# Altium footprint library myPcbLib.PcbLib: 987 footprints (part 54 of 62)
Each footprint in its own frame and in the unit in brackets; x right, y up, seen from the top. Pads: shape width x height; smd on the part's side, far side on the other; paste and mask are expansions set on the pad; w line width, h text height; cw(c..) or ccw(c..) is an arc to the next point about the centre after c.
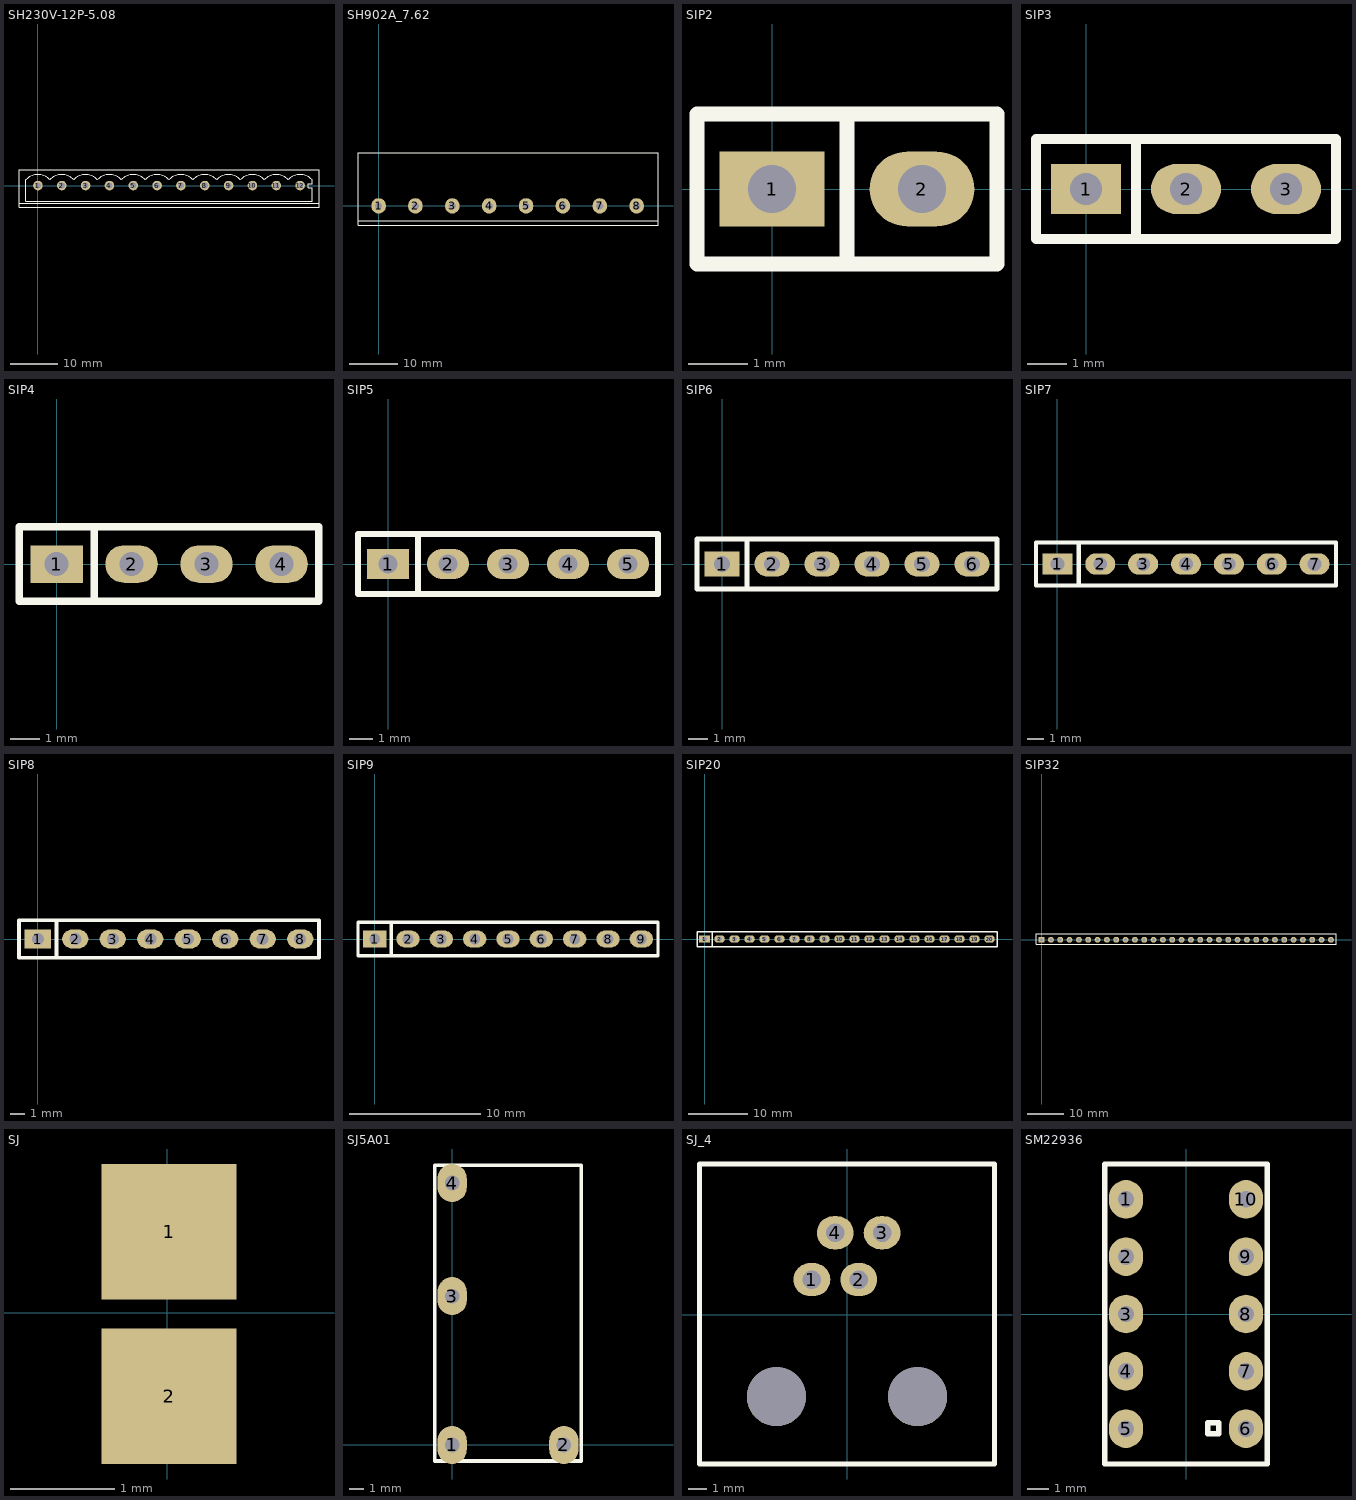
[diagram p53: the footprints below, top view; thin cyan lines are the x and y axes]

## SH230V-12P-5.08 [mil]
height 60
pads (12):
  round 80 hole 52: 1(0,0) 2(200,0) 3(400,0) 4(600,0) 5(800,0) 6(1000,0) 7(1200,0) 8(1400,0) 9(1600,0) 10(1800,0) 11(2000,0) 12(2200,0)
Top Overlay:
  lines w8: -100.96,50.17 cw(c-0.79,-50) 99.39,50.17 ; 99.04,50.17 cw(c199.21,-50) 299.39,50.17 ; 299.04,50.17 cw(c399.21,-50) 499.39,50.17 ; 499.04,50.17 cw(c599.21,-50) 699.39,50.17 ; 699.04,50.17 cw(c799.21,-50) 899.39,50.17 ; 899.04,50.17 cw(c999.21,-50) 1099.39,50.17 ; 1099.04,50.17 cw(c1199.21,-50) 1299.39,50.17 ; 1299.04,50.17 cw(c1399.21,-50) 1499.39,50.17 ; 1499.04,50.17 cw(c1599.21,-50) 1699.39,50.17 ; 1699.04,50.17 cw(c1799.21,-50) 1899.39,50.17 ; 1899.04,50.17 cw(c1999.21,-50) 2099.39,50.17 ; 2099.83,50.17 cw(c2200,-50) 2300.17,50.17
  lines w10: -159.12,-150 2358.33,-150 ; -100.79,50 -100.79,-133.33 2300,-133.33 2300,-16.67 2266.67,-16.67 2266.67,16.67 2300,16.67 2300,50 ; -159.12,-180.31 2358.33,-180.31 2358.33,133.33 -159.12,133.33 -159.12,-180.31

## SH902A_7.62 [mm] "美规端子"
height 15
pads (8):
  oval 3x3.2 hole 1.5: 1(0,0) 2(7.62,0) 3(15.24,0) 4(22.86,0) 5(30.48,0) 6(38.1,0) 7(45.72,0) 8(53.34,0)
Top Overlay:
  lines w0.254: -4.25,0 -4.25,-4 57.75,-4 57.75,-2.5 ; -4.25,-3.1 -4.25,11 57.75,11 57.75,-3.1 -4.25,-3.1

## SIP2 [mil]
pads (2):
  rect 70x50 hole 32: 1(0,0)
  oval 70x50 hole 32: 2(100,0)
Top Overlay:
  lines w10: 50,-50 50,50 ; -50,-50 -50,50 150,50 150,-50 -50,-50

## SIP3 [mil]
pads (3):
  rect 70x50 hole 32: 1(0,0)
  oval 70x50 hole 32: 2(100,0) 3(200,0)
Top Overlay:
  lines w10: 50,-50 50,50 ; -50,-50 -50,50 250,50 250,-50 -50,-50

## SIP4 [mil]
pads (4):
  rect 70x50 hole 32: 1(0,0)
  oval 70x50 hole 32: 2(100,0) 3(200,0) 4(300,0)
Top Overlay:
  lines w10: 50,-50 50,50 ; -50,-50 -50,50 350,50 350,-50 -50,-50

## SIP5 [mil]
pads (5):
  rect 70x50 hole 32: 1(0,0)
  oval 70x50 hole 32: 2(100,0) 3(200,0) 4(300,0) 5(400,0)
Top Overlay:
  lines w10: 50,-50 50,50 ; -50,-50 -50,50 450,50 450,-50 -50,-50

## SIP6 [mil]
pads (6):
  rect 70x50 hole 32: 1(0,0)
  oval 70x50 hole 32: 2(100,0) 3(200,0) 4(300,0) 5(400,0) 6(500,0)
Top Overlay:
  lines w10: 50,-50 50,50 ; -50,-50 550,-50 550,50 -50,50 -50,-50

## SIP7 [mil]
pads (7):
  rect 70x50 hole 32: 1(0,0)
  oval 70x50 hole 32: 2(100,0) 3(200,0) 4(300,0) 5(400,0) 6(500,0) 7(600,0)
Top Overlay:
  lines w10: 50,-50 50,50 ; -50,-50 -50,50 650,50 650,-50 -50,-50

## SIP8 [mil]
pads (8):
  rect 70x50 hole 32: 1(0,0)
  oval 70x50 hole 32: 2(100,0) 3(200,0) 4(300,0) 5(400,0) 6(500,0) 7(600,0) 8(700,0)
Top Overlay:
  lines w10: 50,-50 50,50 ; -50,-50 -50,50 750,50 750,-50 -50,-50

## SIP9 [mil]
pads (9):
  rect 70x50 hole 32: 1(0,0)
  oval 70x50 hole 32: 2(100,0) 3(200,0) 4(300,0) 5(400,0) 6(500,0) 7(600,0) 8(700,0) 9(800,0)
Top Overlay:
  lines w10: 50,-50 50,50 ; -50,-50 850,-50 850,50 -50,50 -50,-50

## SIP20 [mil]
pads (20):
  rect 70x50 hole 32: 1(0,0)
  oval 70x50 hole 32: 2(100,0) 3(200,0) 4(300,0) 5(400,0) 6(500,0) 7(600,0) 8(700,0) 9(800,0) 10(900,0) 11(1000,0) 12(1100,0) 13(1200,0) 14(1300,0) 15(1400,0) 16(1500,0) 17(1600,0) 18(1700,0) 19(1800,0) 20(1900,0)
Top Overlay:
  lines w10: 50,-50 50,50 ; -50,-50 -50,50 1950,50 1950,-50 -50,-50

## SIP32 [mm]
height 17
pads (32):
  rect 1.6x1.6 hole 0.85: 1(0,0)
  round 1.6 hole 0.85: 2(2.54,0) 3(5.08,0) 4(7.62,0) 5(10.16,0) 6(12.7,0) 7(15.24,0) 8(17.78,0) 9(20.32,0) 10(22.86,0) 11(25.4,0) 12(27.94,0) 13(30.48,0) 14(33.02,0) 15(35.56,0) 16(38.1,0) 17(40.64,0) 18(43.18,0) 19(45.72,0) 20(48.26,0) 21(50.8,0) 22(53.34,0) 23(55.88,0) 24(58.42,0) 25(60.96,0) 26(63.5,0) 27(66.04,0) 28(68.58,0) 29(71.12,0) 30(73.66,0) 31(76.2,0) 32(78.74,0)
Top Overlay:
  lines w0.254: -1.5,-1.27 80.137,-1.27 80.137,1.651 -1.5,1.651 -1.5,-1.27

## SJ [mil] "短接点"
pads (2):
  rect 51x51 smd: 1(0.59,30.61) 2(0.59,-31.39)

## SJ5A01 [mm]
pads (4):
  oval 2x2.6 hole 1: 1(0,0) 2(7.62,0) 3(0,10.16) 4(0,17.88)
Top Overlay:
  lines w0.254: -1.19,-1.1 8.81,-1.1 8.81,19.1 -1.19,19.1 -1.19,-1.1

## SJ_4 [mm]
pads (6):
  oval 2x1.8 hole 1: 1(-1.905,1.905) 2(0.635,1.905) 3(1.905,4.445) 4(-0.635,4.445)
  round 3.2 hole 3.2: ""(-3.825,-4.445) ""(3.825,-4.445)
Top Overlay:
  lines w0.254: -8,-8.095 8,-8.095 8,8.175 -8,8.175 -8,-8.095

## SM22936 [mm]
pads (10):
  oval 1.6x1.8 hole 0.762: 1(-2.8,5.35) 2(-2.8,2.675) 3(-2.8,0) 4(-2.8,-2.675) 5(-2.8,-5.35) 6(2.8,-5.35) 7(2.8,-2.675) 8(2.8,0) 9(2.8,2.675) 10(2.8,5.35)
Top Overlay:
  lines w0.254: -3.8,-7 -3.8,7 3.8,7 3.8,-7 -3.8,-7 ; 1.016,-5.588 1.524,-5.588 1.524,-5.08 1.016,-5.08 1.016,-5.588